# Altium footprint library Mine.PcbLib: 306 footprints (part 3 of 20)
Each footprint in its own frame and in the unit in brackets; x right, y up, seen from the top. Pads: shape width x height; smd on the part's side, far side on the other; paste and mask are expansions set on the pad; w line width, h text height; cw(c..) or ccw(c..) is an arc to the next point about the centre after c.
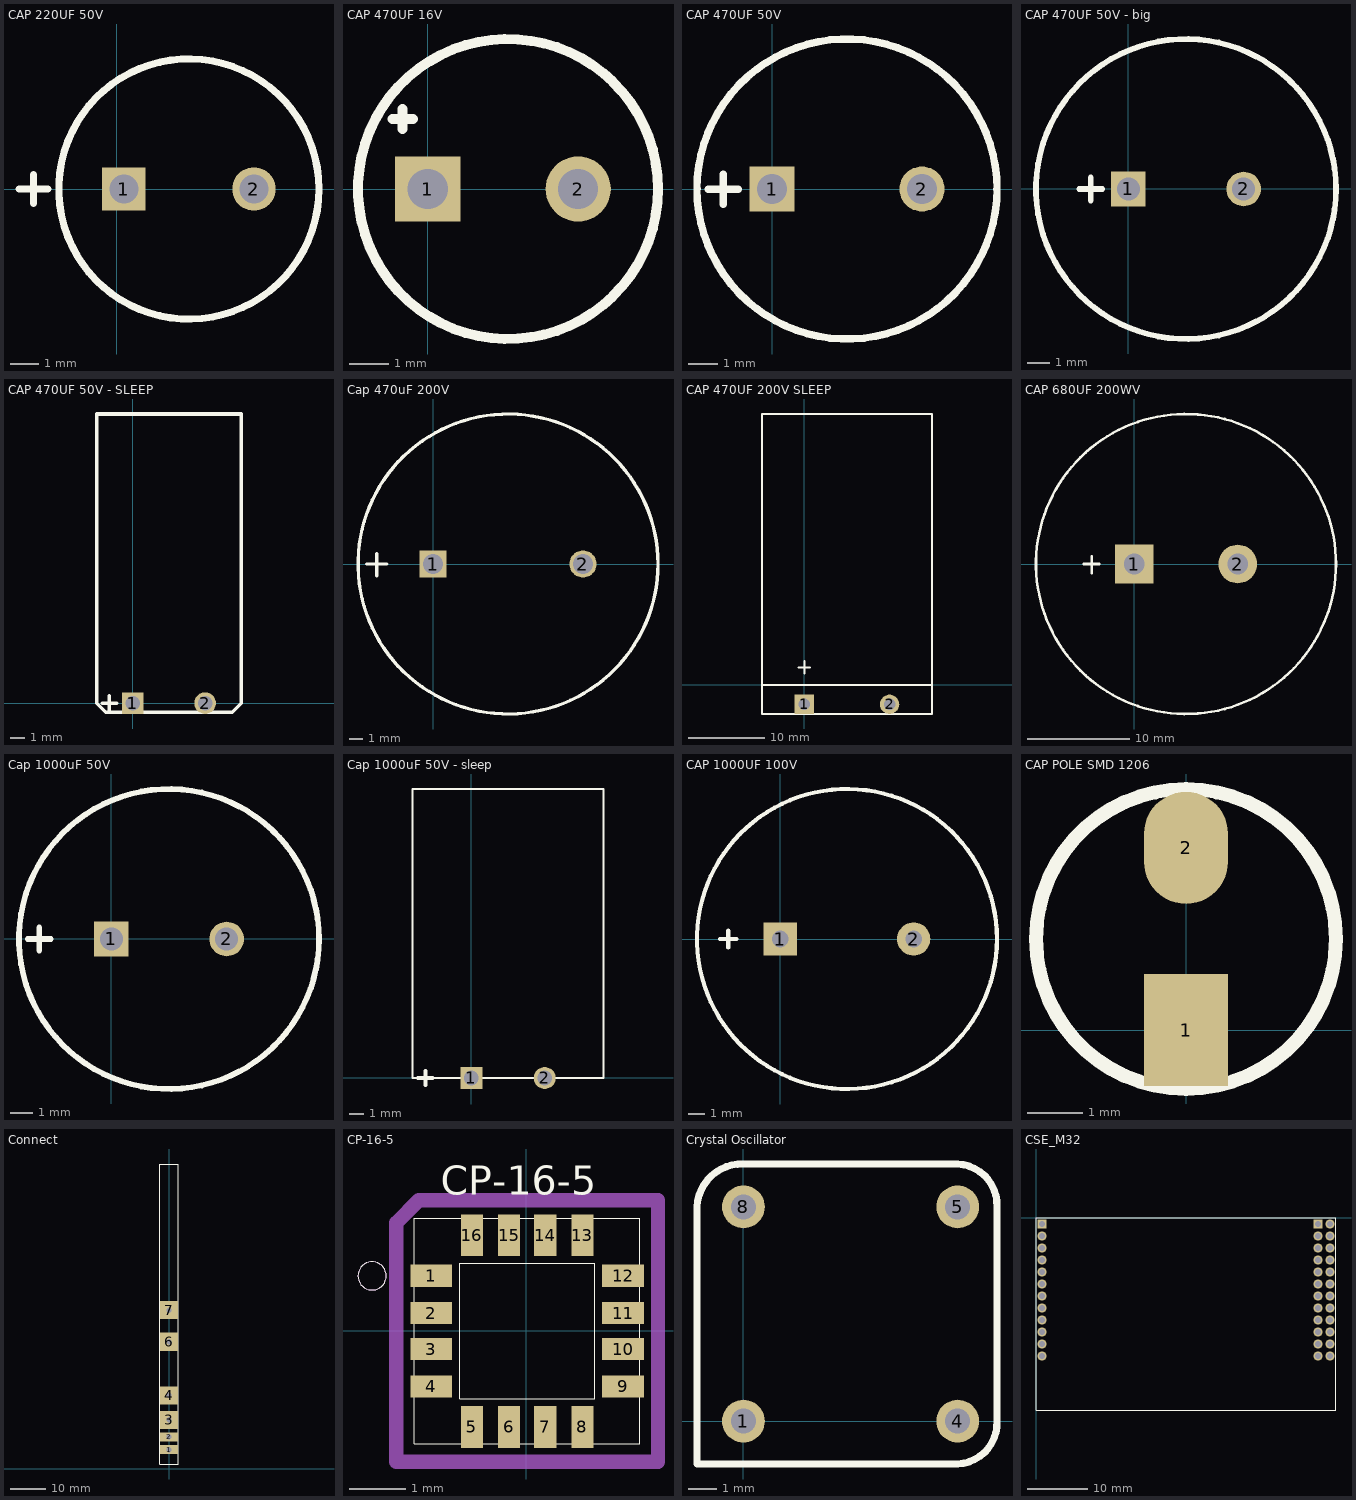
[diagram p2: the footprints below, top view; thin cyan lines are the x and y axes]

## CAP 220UF 50V [mil]
pads (2):
  rect 60x60 hole 40: 1(10,0)
  round 60 hole 40: 2(190,0)
Top Overlay:
  circle w10: c100,0 r180
  lines w10: -135,0 -95,0 ; -115,-20 -115,20

## CAP 470UF 16V [mil]
height 472.44
pads (2):
  rect 65x65 hole 40: 1(0,0)
  round 65 hole 40: 2(150,0)
Top Overlay:
  circle w10: c80,0 r149.61
  lines w10: -35,70 -15,70 ; -25,60 -25,80

## CAP 470UF 50V [mil]
pads (2):
  rect 60x60 hole 40: 1(0,0)
  round 60 hole 40: 2(200,0)
Top Overlay:
  circle w10: c100,0 r200
  lines w10: -85,0 -45,0 ; -65,-20 -65,20

## CAP 470UF 50V - big [mil]
pads (2):
  rect 60x60 hole 40: 1(0,0)
  round 60 hole 40: 2(200,0)
Top Overlay:
  circle w10: c100,0 r260
  lines w10: -85,0 -45,0 ; -65,-20 -65,20

## CAP 470UF 50V - SLEEP [mil]
pads (2):
  rect 60x60 hole 40: 1(0,0)
  round 60 hole 40: 2(200,0)
Top Overlay:
  lines w10: -85,0 -45,0 ; -65,-20 -65,20 ; -100,0 -100,800 300,800 300,0 275,-25 -75,-25 -100,0

## Cap 470uF 200V [mil]
pads (2):
  rect 80x80 hole 60: 1(0,0)
  round 80 hole 60: 2(440,0)
Top Overlay:
  circle w10: c220,0 r440
  lines w10: -195,0 -135,0 ; -165,-35 -165,30

## CAP 470UF 200V SLEEP [mil]
pads (2):
  rect 100x100 hole 60: 1(0,-100)
  round 100 hole 60: 2(440,-100)
Top Overlay:
  lines w10: -30,90 30,90 ; 0,60 0,125 ; -220,0 -220,-150 660,-150 660,0 ; -220,0 660,0 ; -220,0 -220,1400 660,1400 660,0

## CAP 680UF 200WV [mil]
pads (2):
  rect 150x150 hole 80: 1(0,0)
  round 150 hole 80: 2(400,0)
Top Overlay:
  circle w10: c200,0 r580
  lines w10: -195,0 -135,0 ; -165,-35 -165,30

## Cap 1000uF 50V [mil]
height 787.4
pads (2):
  rect 60x60 hole 40: 1(0,0)
  round 60 hole 40: 2(200,0)
Top Overlay:
  circle w10: c100,0 r260
  lines w10: -145,0 -105,0 ; -125,-20 -125,20

## Cap 1000uF 50V - sleep [mil]
height 551.18
pads (2):
  rect 60x60 hole 40: 1(0,0)
  round 60 hole 40: 2(200,0)
Top Overlay:
  lines w5: -160,0 -160,787.4 360,787.4 360,0 -160,0
  lines w10: -145,0 -105,0 ; -125,-20 -125,20

## CAP 1000UF 100V [mil]
pads (2):
  rect 80x80 hole 40: 1(0,0)
  round 80 hole 40: 2(320,0)
Top Overlay:
  circle w10: c160,0 r360
  lines w10: -145,0 -105,0 ; -125,-20 -125,20

## CAP POLE SMD 1206 [mil]
pads (2):
  rect 60x80 smd: 1(0,0)
  oval 60x80 smd: 2(0,130)
Top Overlay:
  circle w10: c0,65 r107

## Connect [mil]
pads (6):
  rect 200x100 hole 60: 1(0,210) 2(0,350)
  rect 200x200 hole 60: 3(0,540) 4(0,810) 6(0,1405) 7(0,1755)
Top Overlay:
  lines w10: -100,50 -100,3375 100,3375 100,50 -100,50

## CP-16-5 [mil]
pads (16):
  rect 29.1x15.4 smd: 1(-66.41,38.46) 2(-66.41,12.46) 3(-66.41,-12.74) 4(-66.41,-38.74) 9(67.39,-38.74) 10(67.39,-12.74) 11(67.39,12.46) 12(67.39,38.46)
  rect 15.4x29.1 smd: 5(-38.11,-67.04) 6(-12.11,-67.04) 7(13.09,-67.04) 8(39.09,-67.04) 13(39.09,66.76) 14(13.09,66.76) 15(-12.11,66.76) 16(-38.11,66.76)
Top Overlay:
  lines w0.4: -117.61,38.41 ccw(c-107.76,38.41) -97.91,38.41 ccw(c-107.76,38.41) -117.61,38.41 ; -78.21,-78.84 79.19,-78.84 79.19,78.56 -78.21,78.56 -78.21,-78.84 ; -46.71,-47.34 47.69,-47.34 47.69,47.06 -46.71,47.06 -46.71,-47.34
  text "CP-16-5" at -60,95 h20
Mechanical 16:
  lines w0.4: -117.61,38.41 ccw(c-107.76,38.41) -97.91,38.41 ccw(c-107.76,38.41) -117.61,38.41
  lines w10: -90.81,-91.44 91.79,-91.44 91.79,91.16 -75.11,91.16 -90.81,75.46 -90.81,-91.44

## Crystal Oscillator [mil]
height 236.22
pads (4):
  round 60 hole 35: 1(0,0) 4(300,0) 5(300,300) 8(0,300)
Top Overlay:
  lines w10: -65,-60 -65,300 cw(c-2.5,297.5) 0,360 300,360 cw(c297.5,302.5) 355,300 355,0 cw(c297.5,-2.5) 300,-60 -65,-60

## CSE_M32 [mil]
height 393.7
pads (36):
  rect 60x60 hole 40: 1_1(39.37,-39.37) 2_1(1850.39,-39.37)
  round 60 hole 40: 1_2(39.37,-118.11) 1_3(39.37,-196.85) 1_4(39.37,-275.59) 1_5(39.37,-354.33) 1_6(39.37,-433.07) 1_7(39.37,-511.81) 1_8(39.37,-590.55) 1_9(39.37,-669.29) 1_10(39.37,-748.03) 1_11(39.37,-826.77) 1_12(39.37,-905.51) 2_2(1929.13,-39.37) 2_3(1850.39,-118.11) 2_4(1929.13,-118.11) 2_5(1850.39,-196.85) 2_6(1929.13,-196.85) 2_7(1850.39,-275.59) 2_8(1929.13,-275.59) 2_9(1850.39,-354.33) 2_10(1929.13,-354.33) 2_11(1850.39,-433.07) 2_12(1929.13,-433.07) 2_13(1850.39,-511.81) 2_14(1929.13,-511.81) 2_15(1850.39,-590.55) 2_16(1929.13,-590.55) 2_17(1850.39,-669.29) 2_18(1929.13,-669.29) 2_19(1850.39,-748.03) 2_20(1929.13,-748.03) 2_21(1850.39,-826.77) 2_22(1929.13,-826.77) 2_23(1850.39,-905.51) 2_24(1929.13,-905.51)
Top Overlay:
  lines w5: 0,-1259.84 0,0 1968.5,0 1968.5,-1259.84 0,-1259.84